# Altium footprint library PCB封装库.PcbLib: 109 footprints (part 2 of 7)
Each footprint in its own frame and in the unit in brackets; x right, y up, seen from the top. Pads: shape width x height; smd on the part's side, far side on the other; paste and mask are expansions set on the pad; w line width, h text height; cw(c..) or ccw(c..) is an arc to the next point about the centre after c.
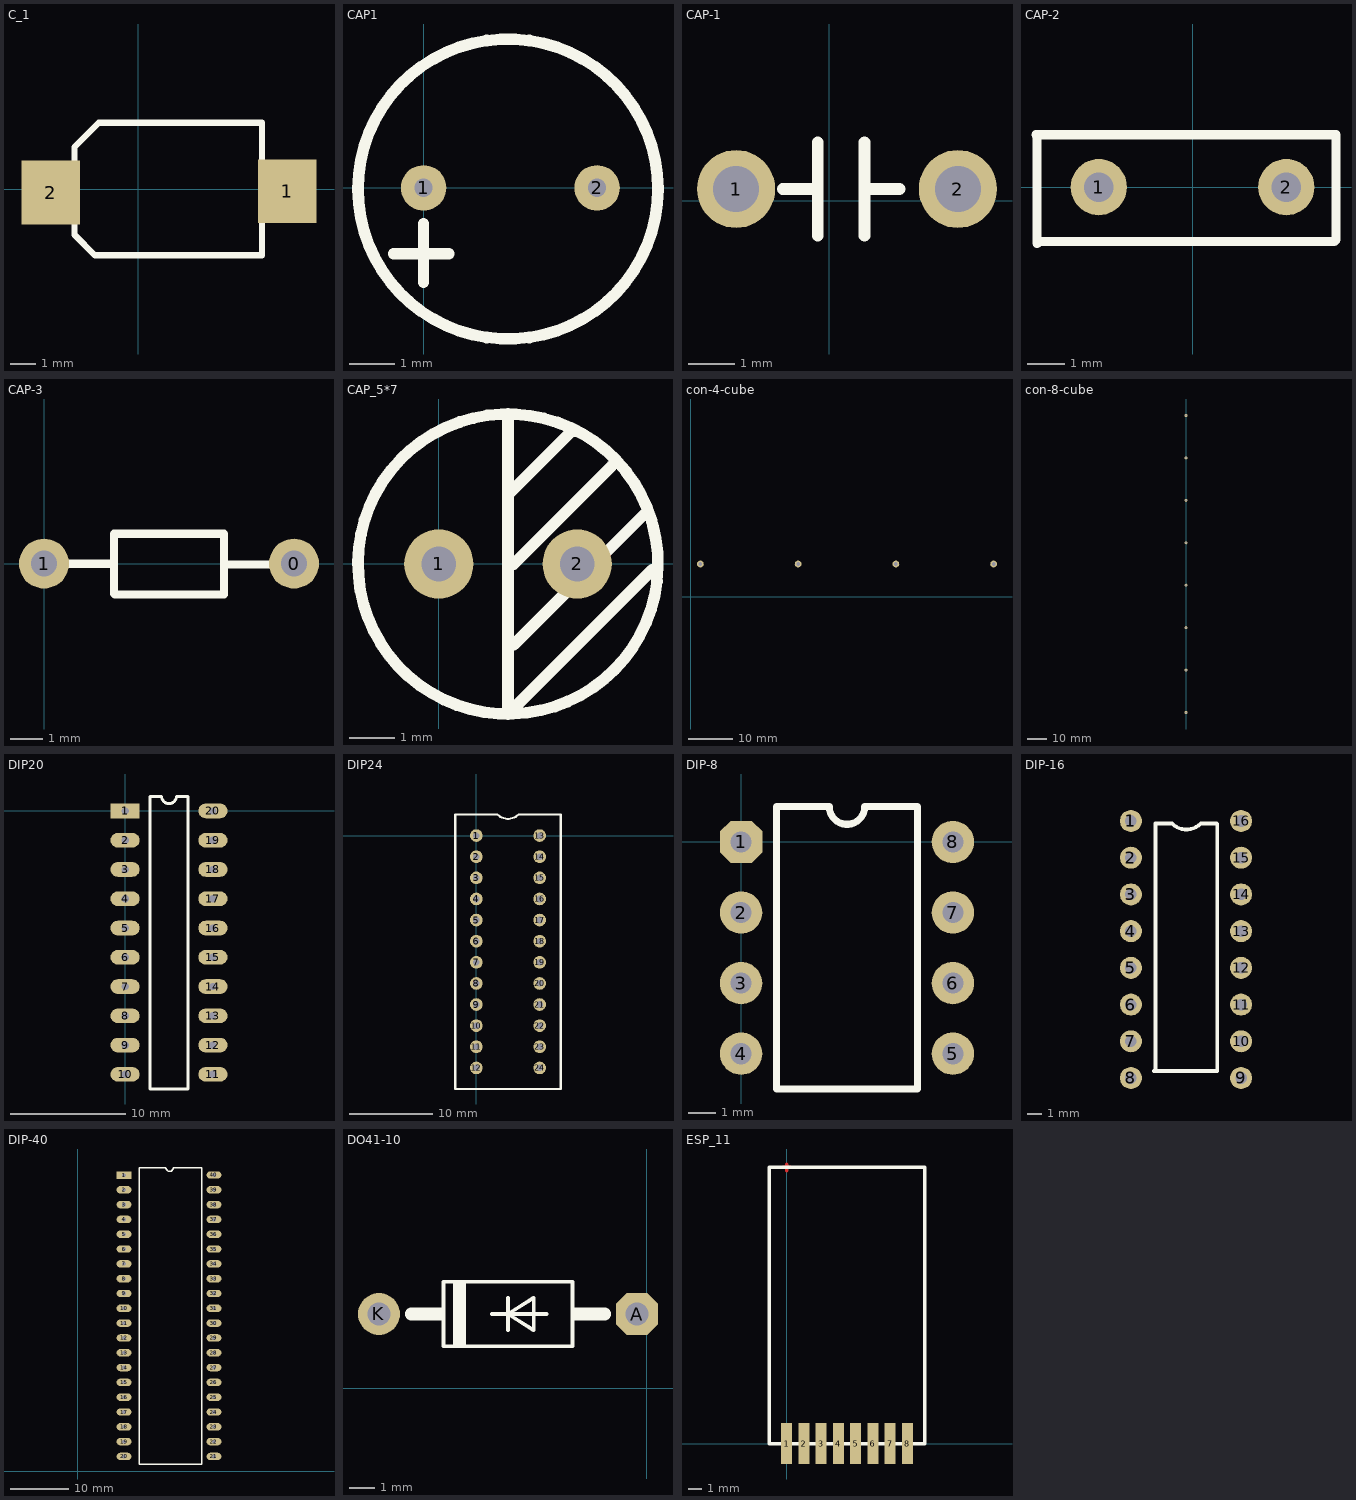
[diagram p1: the footprints below, top view; thin cyan lines are the x and y axes]

## C_1 [mm]
pads (2):
  rect 2.3x2.5 smd: 1(5.842,-0.076) 2(-3.429,-0.127)
Top Overlay:
  lines w0.245: -2.5,-1.793 -1.702,-2.591 4.851,-2.591 4.851,2.616 -1.549,2.616 -2.5,1.666 -2.5,-1.793

## CAP1 [mm]
pads (2):
  round 1 hole 0.4: 1(0,0) 2(3.81,0)
Top Overlay:
  circle w0.254: c1.854,-0.025 r3.296
  lines w0.245: -0.66,-1.448 0.559,-1.448 ; 0,-2.083 0,-0.787

## CAP-1 [mm]
pads (2):
  round 1.7 hole 1: 1(-2.032,0.254) 2(2.794,0.254)
Top Overlay:
  lines w0.254: -1.016,0.254 -0.254,0.254 ; -0.254,-0.762 -0.254,1.27 ; 0.762,-0.762 0.762,1.27 ; 0.762,0.254 1.524,0.254
3D body: height 2.54, standoff -9.97, extent -2.934,-2.81 3.442,3.556

## CAP-2 [mil]
pads (2):
  round 60 hole 31.5: 1(-100,0) 2(100,0)
Top Overlay:
  lines w10: -167,56 153,56 153,-56 151,-58 -164,-58 -166,-60 -166,51

## CAP-3 [mil]
pads (2):
  round 60 hole 31.5: 0(300,0) 1(0,0)
Top Overlay:
  lines w10: 0,0 82,0 ; 216,-1 299,-1 ; 84,-36 85,-37 216,-37 216,36 84,36 84,-36

## CAP_5*7 [mil]
pads (2):
  round 60 hole 30: 1(0,0) 2(120,0)
Top Overlay:
  lines w10: 60,-70 65,-70 180,45 ; 60,130 60,-130 60,60 115,115 120,115 ; 65,-125 185,-5 ; 65,0 150,85 ; 184.72,36.68 ccw(c60,0) 185.53,33.8
3D body: height 649.61, standoff -118.11, extent -80,-138.45 186.57,128.45

## con-4-cube [mil]
pads (4):
  round 60 hole 31.5: 1(86.14,290) 2(952.28,290) 3(1818.43,290) 4(2684.57,290)

## con-8-cube [mil]
pads (8):
  round 60 hole 31.5: 1(0,-866.14) 2(0,-1732.28) 3(0,-2598.43) 4(0,-3464.57) 5(0,-4330.71) 6(0,-5196.85) 7(0,-6062.99) 8(0,-6929.13)

## DIP8 [mm]

## DIP20 [mm]
pads (20):
  rect 2.54x1.27 hole 0.635: 1(0,0)
  oval 2.54x1.27 hole 0.635: 2(0,-2.54) 3(0,-5.08) 4(0,-7.62) 5(0,-10.16) 6(0,-12.7) 7(0,-15.24) 8(0,-17.78) 9(0,-20.32) 10(0,-22.86) 11(7.62,-22.86) 12(7.62,-20.32) 13(7.62,-17.78) 14(7.62,-15.24) 15(7.62,-12.7) 16(7.62,-10.16) 17(7.62,-7.62) 18(7.62,-5.08) 19(7.62,-2.54) 20(7.62,0)
Top Overlay:
  lines w0.254: 2.159,-24.13 5.461,-24.13 5.461,1.27 4.445,1.27 cw(c3.81,1.27) 3.175,1.27 2.159,1.27 2.159,-24.13

## DIP24 [mil]
pads (24):
  round 60 hole 31.5: 1(0,0) 2(0,-100) 3(0,-200) 4(0,-300) 5(0,-400) 6(0,-500) 7(0,-600) 8(0,-700) 9(0,-800) 10(0,-900) 11(0,-1000) 12(0,-1100) 13(300,0) 14(300,-100) 15(300,-200) 16(300,-300) 17(300,-400) 18(300,-500) 19(300,-600) 20(300,-700) 21(300,-800) 22(300,-900) 23(300,-1000) 24(300,-1100)
Top Overlay:
  lines w10: -100,-1200 -100,100 100,100 ccw(c150,150) 200,100 400,100 400,-1200 -100,-1200

## DIP-8 [mil]
pads (8):
  oct 60x60 hole 30: 1(0,0)
  round 60 hole 30: 2(0,-100) 3(0,-200) 4(0,-300) 5(300,-300) 6(300,-200) 7(300,-100) 8(300,0)
Top Overlay:
  lines w10: 50,-350 50,50 125,50 ccw(c150,50) 175,50 250,50 250,-350 50,-350
3D body: height 200, standoff -98.03, extent -4.92,-364.96 304.92,64.96

## DIP-16 [mil]
pads (16):
  round 60 hole 31.5: 1(500,3900) 2(500,3800) 3(500,3700) 4(500,3600) 5(500,3500) 6(500,3400) 7(500,3300) 8(500,3200) 9(800,3200) 10(800,3300) 11(800,3400) 12(800,3500) 13(800,3600) 14(800,3700) 15(800,3800) 16(800,3900)
Top Overlay:
  lines w10: 563,3219 735,3219 735,3892 734,3893 690,3893 cw(c651,3932) 612,3893 568,3893 567,3894 567,3223 563,3219
3D body: height 165, standoff -101, extent 493,3123 803,3973

## DIP-40 [mil]
pads (40):
  rect 100x50 hole 25: 1(313,1999)
  oval 100x50 hole 25: 2(313,1900) 3(313,1800) 4(313,1700) 5(313,1600) 6(313,1500) 7(313,1400) 8(313,1300) 9(313,1200) 10(313,1100) 11(313,1000) 12(313,900) 13(313,800) 14(313,700) 15(313,600) 16(313,500) 17(313,400) 18(313,300) 19(313,200) 20(313,100) 21(920,100) 22(920,200) 23(920,300) 24(920,400) 25(920,500) 26(920,600) 27(920,700) 28(920,800) 29(920,900) 30(920,1000) 31(920,1100) 32(920,1200) 33(920,1300) 34(920,1400) 35(920,1500) 36(920,1600) 37(920,1700) 38(920,1800) 39(920,1900) 40(920,2000)
Top Overlay:
  lines w10: 414,49 836,49 836,2049 645,2049 cw(c620,2049) 595,2049 414,2049 414,49
3D body: height 330.23, standoff -109.14, extent 271.54,25.52 964.46,2083

## DO41-10 [mil]
pads (2):
  oct 65x65 hole 35: A(-15,115)
  round 65 hole 35: K(-415,115)
Top Overlay:
  region: -315,125 -328,125 -328,105 -315,105
  rectangle: -115,105 -102,125
  rectangle: -300,65 -280,165
  lines w6: -240,115 -215,115 ; -215,90 -215,115 ; -215,140 -215,115 ; -155,115 -215,115 ; -215,115 -175,90 -175,140 -215,115 ; -315,65 -115,65 -115,165 -315,165 -315,65
  lines w20: -365,115 -328,115 ; -102,115 -65,115
3D body: height 100.5, standoff -100, extent -430,64.5 0,165.5

## ESP_11 [mm]
pads (8):
  rect 0.8x3 smd: 1(0,0) 2(1.27,0) 3(2.54,0) 4(3.81,0) 5(5.08,0) 6(6.35,0) 7(7.62,0) 8(8.89,0)
Top Layer:
  lines w0.254: -0.254,20.32 0.254,20.32 ; 0,20.066 0,20.574
  text "0,20.32 (mm)" at 0.254,20.32 h1.52
Top Overlay:
  lines w0.254: -1.27,0 -1.27,20.32 10.16,20.32 10.16,0 -1.27,0